# Altium footprint library Jetson-Nano-Baseboard.PcbLib: 60 footprints (part 4 of 4)
Each footprint in its own frame and in the unit in brackets; x right, y up, seen from the top. Pads: shape width x height; smd on the part's side, far side on the other; paste and mask are expansions set on the pad; w line width, h text height; cw(c..) or ccw(c..) is an arc to the next point about the centre after c.
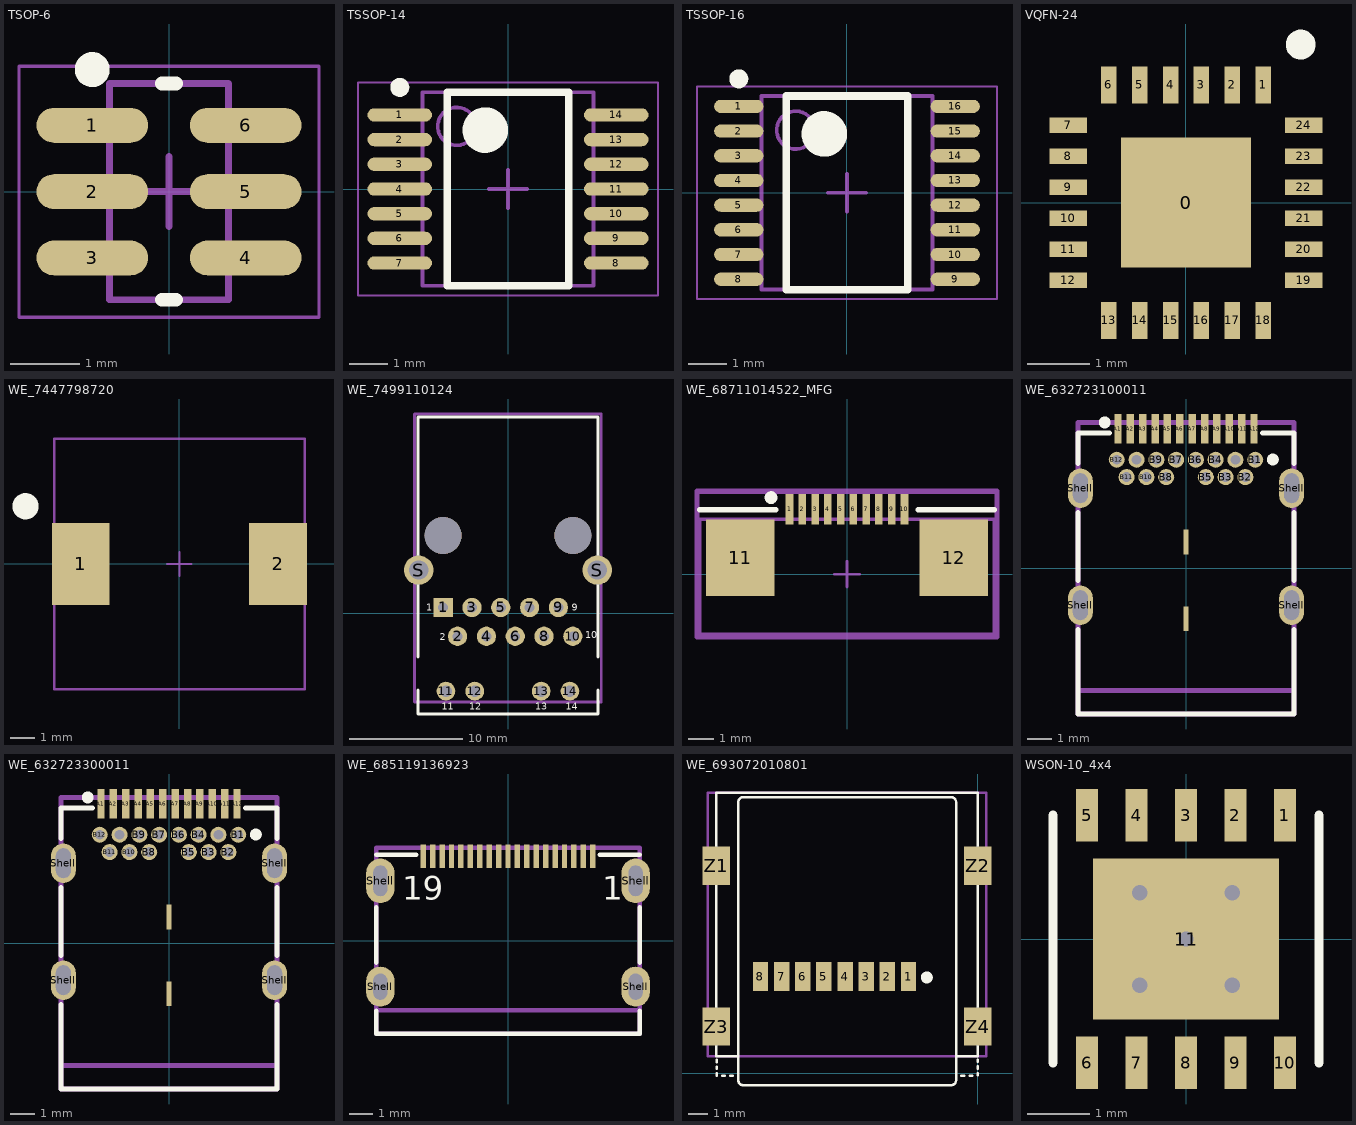
[diagram p3: the footprints below, top view; thin cyan lines are the x and y axes]

## TSOP-6 [mm]
height 1.1
pads (6):
  oval 1.6x0.5 smd: 1(-1.1,0.95) 2(-1.1,0) 3(-1.1,-0.95) 4(1.1,-0.95) 5(1.1,0) 6(1.1,0.95)
Top Overlay:
  circle w0.25: c-1.1,1.75 r0.125
  lines w0.2: -0.1,-1.55 0.1,-1.55 ; -0.1,1.55 0.1,1.55
Mechanical 13:
  lines w0.1: -0.85,-1.55 -0.85,1.55 0.85,1.55 0.85,-1.55 -0.85,-1.55
Mechanical 15:
  lines w0.05: -2.15,-1.8 -2.15,1.8 2.15,1.8 2.15,-1.8 -2.15,-1.8
  lines w0.1: -0.5,0 0.5,0 ; 0,-0.5 0,0.5
3D body: height 1.1, standoff 0.05, extent -0.85,-1.55 0.85,1.55

## TSSOP-14 [mm]
height 1.1
pads (14):
  oval 1.7x0.35 smd: 1(-2.85,1.95) 2(-2.85,1.3) 3(-2.85,0.65) 4(-2.85,0) 5(-2.85,-0.65) 6(-2.85,-1.3) 7(-2.85,-1.95) 8(2.85,-1.95) 9(2.85,-1.3) 10(2.85,-0.65) 11(2.85,0) 12(2.85,0.65) 13(2.85,1.3) 14(2.85,1.95)
Top Overlay:
  circle w0.25: c-2.85,2.675 r0.125
  circle w0.6: c-0.6,1.55 r0.3
  lines w0.2: -1.6,-2.55 -1.6,2.55 1.6,2.55 1.6,-2.55 -1.6,-2.55
Mechanical 13:
  circle w0.1: c-1.35,1.65 r0.5
  lines w0.1: -2.25,-2.55 -2.25,2.55 2.25,2.55 2.25,-2.55 -2.25,-2.55
Mechanical 15:
  lines w0.05: -3.95,-2.8 -3.95,2.8 3.95,2.8 3.95,-2.8 -3.95,-2.8
  lines w0.1: -0.5,0 0.5,0 ; 0,-0.5 0,0.5
3D body: height 1.21, standoff 0.01, extent -3.2,-2.5 3.2,2.5

## TSSOP-16 [mm]
height 1.1
pads (16):
  oval 1.3x0.35 smd: 1(-2.85,2.275) 2(-2.85,1.625) 3(-2.85,0.975) 4(-2.85,0.325) 5(-2.85,-0.325) 6(-2.85,-0.975) 7(-2.85,-1.625) 8(-2.85,-2.275) 9(2.85,-2.275) 10(2.85,-1.625) 11(2.85,-0.975) 12(2.85,-0.325) 13(2.85,0.325) 14(2.85,0.975) 15(2.85,1.625) 16(2.85,2.275)
Top Overlay:
  circle w0.25: c-2.85,3 r0.125
  circle w0.6: c-0.6,1.55 r0.3
  lines w0.2: -1.6,-2.55 -1.6,2.55 1.6,2.55 1.6,-2.55 -1.6,-2.55
Mechanical 13:
  circle w0.1: c-1.35,1.65 r0.5
  lines w0.1: -2.25,-2.55 -2.25,2.55 2.25,2.55 2.25,-2.55 -2.25,-2.55
Mechanical 15:
  lines w0.05: -3.95,-2.8 -3.95,2.8 3.95,2.8 3.95,-2.8 -3.95,-2.8
  lines w0.1: -0.5,0 0.5,0 ; 0,-0.5 0,0.5
3D body: height 1.1, standoff 0, extent -3.2,-2.5 3.2,2.5

## VQFN-24 [mm]
height 0.9
pads (25):
  rect 2.1x2.1 smd: 0(0,0)
  rect 0.25x0.6 smd: 1(1.25,1.9) 2(0.75,1.9) 3(0.25,1.9) 4(-0.25,1.9) 5(-0.75,1.9) 6(-1.25,1.9) 13(-1.25,-1.9) 14(-0.75,-1.9) 15(-0.25,-1.9) 16(0.25,-1.9) 17(0.75,-1.9) 18(1.25,-1.9)
  rect 0.6x0.25 smd: 7(-1.9,1.25) 8(-1.9,0.75) 9(-1.9,0.25) 10(-1.9,-0.25) 11(-1.9,-0.75) 12(-1.9,-1.25) 19(1.9,-1.25) 20(1.9,-0.75) 21(1.9,-0.25) 22(1.9,0.25) 23(1.9,0.75) 24(1.9,1.25)
Top Overlay:
  circle w0.3: c1.85,2.55 r0.09
3D body: height 0.8, standoff 0, extent -2.01,-2.01 2.01,2.01

## WE_7447798720 [mm]
height 4.5
pads (2):
  rect 2.4x3.4 smd: 1(-4.1,0) 2(4.1,0)
Top Overlay:
  circle w0.55: c-6.4,2.4 r0.27
Mechanical 13:
  lines w0.1: -5.2,-5.2 5.2,-5.2 5.2,5.2 -5.2,5.2 -5.2,-5.2
Mechanical 15:
  lines w0.05: -5.2,-5.2 5.2,-5.2 5.2,5.2 -5.2,5.2 -5.2,-5.2
  lines w0.1: -0.5,0 0.5,0 ; 0,-0.5 0,0.5
3D body: height 6.35, standoff -0.05, extent -5.1,-5.1 5.1,5.1

## WE_7499110124 [mm] "WE-RJ45 LAN Transformer, THT"
height 13.55
pads (18):
  rect 1.7x1.7 hole 0.89: 1(-5.715,0.51)
  round 1.7 hole 0.89: 2(-4.445,-2.03) 3(-3.175,0.51) 4(-1.905,-2.03) 5(-0.635,0.51) 6(0.635,-2.03) 7(1.905,0.51) 8(3.175,-2.03) 9(4.445,0.51) 10(5.715,-2.03)
  round 1.65 hole 1.02: 11(-5.469,-6.86) 12(-2.929,-6.86) 13(2.921,-6.86) 14(5.461,-6.86)
  round 2.6 hole 1.7: S(-7.878,3.81) S(7.878,3.81)
  round 3.25 hole 3.25 unplated paste+0: ""(-5.715,6.86) ""(5.715,6.86)
Top Overlay:
  lines w0.254: -7.94,-6.78 -7.94,-8.88 7.94,-8.88 7.94,-6.78 ; -7.925,-3.86 -7.925,17.3 7.925,17.3 7.925,-3.86
  text "14" at 5.08,-8.507 h0.6
  text "13" at 2.413,-8.507 h0.6
  text "12" at -3.429,-8.507 h0.6
  text "11" at -5.842,-8.507 h0.6
  text "10" at 6.8,-2.18 h0.6
  text "9" at 5.6,0.22 h0.6
  text "2" at -6,-2.38 h0.6
  text "1" at -7.2,0.22 h0.6
Mechanical 13:
  lines w0.254: -8.25,-7.83 8.225,-7.83 8.225,17.57 -8.25,17.57 -8.25,-7.83
3D body: height 13.35, standoff -3.7, extent -8.2,-7.725 8.2,17.575

## WE_68711014522_MFG [mm]
pads (12):
  rect 0.3x1.2 smd paste+0 mask+0: 1(-2.25,2.55) 2(-1.75,2.55) 3(-1.25,2.55) 4(-0.75,2.55) 5(-0.25,2.55) 6(0.25,2.55) 7(0.75,2.55) 8(1.25,2.55) 9(1.75,2.55) 10(2.25,2.55)
  rect 2.7x3 smd paste+0 mask+0: 11(-4.18,0.65) 12(4.18,0.65)
Top Overlay:
  circle w0.25: c-2.975,3 r0.125
  lines w0.2: -5.775,2.525 -2.775,2.525 ; 2.775,2.525 5.775,2.525
Mechanical 10:
  lines w0.2: -5.875,-2.45 5.875,-2.45 5.875,3.25 -5.875,3.25 -5.875,-2.45
  text ".Designator" at 0,0.4 h1
Mechanical 12:
  lines w0.15: -5.775,-2.35 5.775,-2.35 5.775,2.15 -5.775,2.15 -5.775,-2.35
Mechanical 15:
  lines w0.1: -0.5,0 0.5,0 ; 0,-0.5 0,0.5
  lines w0.2: -5.875,-2.45 5.875,-2.45 5.875,3.25 -5.875,3.25 -5.875,-2.45
3D body: height 0.25, standoff 0, extent -5.875,-2.45 5.875,3.25

## WE_632723100011 [mm] "USB 3.1 Type C Receptacle Horizontal THR"
height 2.96
pads (32):
  rect 0.3x1.2 smd: A1(-2.75,5.635) A2(-2.25,5.635) A3(-1.75,5.635) A4(-1.25,5.635) A5(-0.75,5.635) A6(-0.25,5.635) A7(0.25,5.635) A8(0.75,5.635) A9(1.25,5.635) A10(1.75,5.635) A11(2.25,5.635) A12(2.75,5.635)
  round 0.65 hole 0.4: B1(2.8,4.385) B2(2.4,3.685) B3(1.6,3.685) B4(1.2,4.385) B5(0.8,3.685) B6(0.4,4.385) B7(-0.4,4.385) B8(-0.8,3.685) B9(-1.2,4.385) B10(-1.6,3.685) B11(-2.4,3.685) B12(-2.8,4.385) Shell(-2,4.385) Shell(2,4.385)
  oval 1x1.6 hole 0.6 slot 1.2 at 90 deg: Shell(-4.27,-1.495) Shell(-4.27,3.235) Shell(4.27,-1.495) Shell(4.27,3.235)
  rect 0.2x1 smd: ""(0,-2.045) ""(0,1.055)
Top Overlay:
  circle w0.25: c-3.288,5.895 r0.114
  circle w0.25: c3.512,4.395 r0.114
  lines w0.2: -4.37,-2.485 -4.37,-5.895 4.37,-5.895 4.37,-2.485 ; -4.37,-0.495 -4.37,2.245 ; -4.37,4.225 -4.37,5.465 -3.1,5.465 ; 3.1,5.465 4.37,5.465 4.37,4.225 ; 4.37,-0.495 4.37,2.245
Mechanical 13:
  lines w0.2: -4.37,-5.895 4.37,-5.895 4.37,5.895 -4.37,5.895 -4.37,-5.895
Mechanical 15:
  lines w0.2: -4.37,-4.945 4.37,-4.945
3D body: height 3.05, standoff -1.81, extent -4.37,-5.895 4.37,5.899

## WE_632723300011 [mm] "USB 3.1 Type C Receptacle Horizontal THR"
height 2.96
pads (32):
  rect 0.3x1.2 smd: A1(-2.75,5.635) A2(-2.25,5.635) A3(-1.75,5.635) A4(-1.25,5.635) A5(-0.75,5.635) A6(-0.25,5.635) A7(0.25,5.635) A8(0.75,5.635) A9(1.25,5.635) A10(1.75,5.635) A11(2.25,5.635) A12(2.75,5.635)
  round 0.65 hole 0.4: B1(2.8,4.385) B2(2.4,3.685) B3(1.6,3.685) B4(1.2,4.385) B5(0.8,3.685) B6(0.4,4.385) B7(-0.4,4.385) B8(-0.8,3.685) B9(-1.2,4.385) B10(-1.6,3.685) B11(-2.4,3.685) B12(-2.8,4.385) Shell(-2,4.385) Shell(2,4.385)
  oval 1x1.6 hole 0.6 slot 1.2 at 90 deg: Shell(-4.27,-1.495) Shell(-4.27,3.235) Shell(4.27,-1.495) Shell(4.27,3.235)
  rect 0.2x1 smd: ""(0,-2.045) ""(0,1.055)
Top Overlay:
  circle w0.25: c-3.288,5.895 r0.114
  circle w0.25: c3.512,4.395 r0.114
  lines w0.2: -4.37,-2.485 -4.37,-5.895 4.37,-5.895 4.37,-2.485 ; -4.37,-0.495 -4.37,2.245 ; -4.37,4.225 -4.37,5.465 -3.1,5.465 ; 3.1,5.465 4.37,5.465 4.37,4.225 ; 4.37,-0.495 4.37,2.245
Mechanical 13:
  lines w0.2: -4.37,-5.895 4.37,-5.895 4.37,5.895 -4.37,5.895 -4.37,-5.895
Mechanical 15:
  lines w0.2: -4.37,-4.945 4.37,-4.945
3D body: height 3.05, standoff -1.81, extent -4.37,-5.895 4.37,5.899

## WE_685119136923 [mm] "Mini HDMI SMT Horizontal"
height 3.3
pads (23):
  rect 0.23x1 smd: 1(3.6,3.6) 2(3.2,3.6) 3(2.8,3.6) 4(2.4,3.6) 5(2,3.6) 6(1.6,3.6) 7(1.2,3.6) 8(0.8,3.6) 9(0.4,3.6) 10(0,3.6) 11(-0.4,3.6) 12(-0.8,3.6) 13(-1.2,3.6) 14(-1.6,3.6) 15(-2,3.6) 16(-2.4,3.6) 17(-2.8,3.6) 18(-3.2,3.6) 19(-3.6,3.6)
  oval 1.2x1.7 hole 0.6 slot 1.1 at 90 deg: Shell(-5.425,-1.95) Shell(5.425,-1.95)
  oval 1.2x1.9 hole 0.6 slot 1.3 at 90 deg: Shell(-5.425,2.55) Shell(5.425,2.55)
Top Overlay:
  lines w0.2: -5.6,-2.98 -5.6,-3.95 5.6,-3.95 5.6,-2.98 ; -5.6,-0.92 -5.6,1.42 ; -5.6,3.65 -3.9,3.65 ; 3.9,3.65 5.6,3.65 ; 5.6,-0.92 5.6,1.42
  text "1" at 4,1.75 h1.02
  text "19" at -4.5,1.75 h1.02
Mechanical 13:
  lines w0.2: -5.6,-3.95 -5.6,3.95 5.6,3.95 5.6,-3.95 -5.6,-3.95
Mechanical 15:
  lines w0.2: -5.6,-2.95 5.6,-2.95
  text "PCB Edge" at -1.794,-2.646 h0.89
3D body: height 3.29, standoff -2.16, extent -5.625,-3.95 5.625,3.952

## WE_693072010801 [mm] "WR-CRD Micro SD_Hinge_8 pins"
height 1.75
pads (12):
  rect 0.8x1.5 smd: 1(-3.601,5.028) 2(-4.701,5.028) 3(-5.801,5.028) 4(-6.901,5.028) 5(-8.001,5.028) 6(-9.101,5.028) 7(-10.201,5.028) 8(-11.301,5.028)
  rect 1.45x2 smd: Z1(-13.601,10.778) Z2(-0.001,10.778) Z3(-13.601,2.428) Z4(-0.001,2.428)
Top Overlay:
  circle w0.32: c-2.651,4.978 r0.15
  lines w0.127: -13.58,-0.124 -13.58,-0.003 ; -13.58,0.226 -13.58,0.347 ; -13.58,0.578 -13.58,0.688 ; -13.297,-0.125 -13.155,-0.125 ; -12.873,-0.125 -12.732,-0.125 ; -12.451,0.878 -13.601,0.878 -13.601,14.578 -0.001,14.578 -0.001,0.879 ; -1.381,14.353 cw(c-1.381,14.103) -1.131,14.103 -1.131,-0.122 -1.131,-0.372 cw(c-1.381,-0.372) -1.381,-0.622 ; -1.376,14.353 -12.201,14.353 ccw(c-12.201,14.103) -12.451,14.103 -12.451,-0.122 -12.451,-0.372 ccw(c-12.201,-0.372) -12.201,-0.622 -1.376,-0.622 ; -1.129,0.878 0,0.878 ; -0.849,-0.122 -0.707,-0.122 ; -0.425,-0.122 -0.284,-0.122 ; 0,-0.121 0,0 ; 0,0.229 0,0.35 ; 0,0.581 0,0.691
Mechanical 13:
  lines w0.127: -14.051,0.878 -14.051,14.578 0.449,14.578 0.449,0.878 -14.051,0.878
3D body: height 1.78, standoff 0.01, extent -14.051,0.878 0.449,14.578

## WSON-10_4x4 [mm] "QFN, 10-Leads, Body 4,00x4,00mm, Pitch 0,65mm, Thermal Pad 2,50x3,15mm, IPC Medium Density"
height 0.8
pads (11):
  rect 0.356x0.85 smd: 1(1.6,2) 2(0.8,2) 3(0,2) 4(-0.8,2) 5(-1.6,2) 6(-1.6,-2) 7(-0.8,-2) 8(0,-2) 9(0.8,-2) 10(1.6,-2)
  rect 3x2.6 smd: 11(0,0)
via -0.75,0.75 diameter 0.6 hole 0.25
via -0.75,-0.75 diameter 0.6 hole 0.25
via 0.75,-0.75 diameter 0.6 hole 0.25
via 0,0 diameter 0.6 hole 0.25
via 0.75,0.75 diameter 0.6 hole 0.25
Top Overlay:
  lines w0.15: -2.15,-2 -2.15,2 ; 2.15,-2 2.15,2
3D body: height 0.8, standoff 0, extent -2,-2.02 2,2.02